# Altium footprint library xhayqua.PcbLib: 185 footprints (part 7 of 12)
Each footprint in its own frame and in the unit in brackets; x right, y up, seen from the top. Pads: shape width x height; smd on the part's side, far side on the other; paste and mask are expansions set on the pad; w line width, h text height; cw(c..) or ccw(c..) is an arc to the next point about the centre after c.
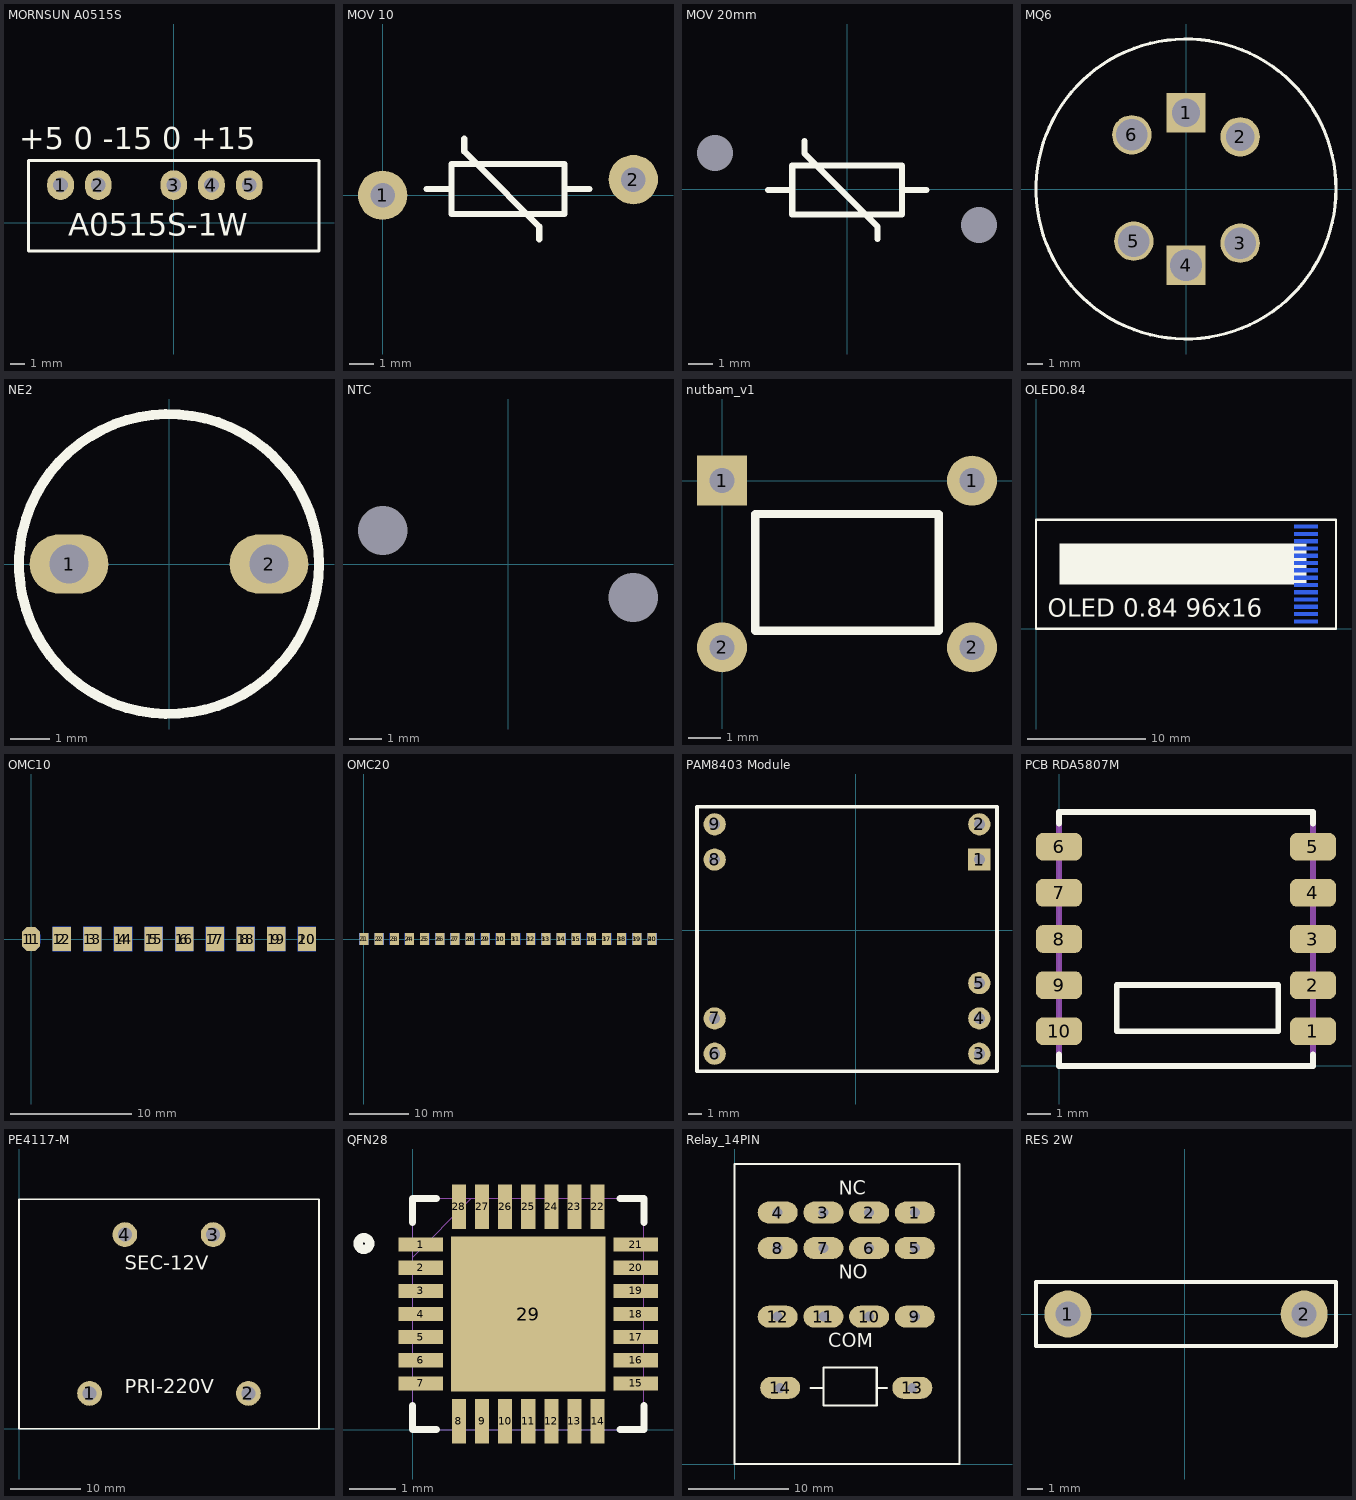
[diagram p6: the footprints below, top view; thin cyan lines are the x and y axes]

## MORNSUN A0515S [mm]
pads (5):
  oval 1.8x2 hole 1: 1(-7.62,2.54) 2(-5.08,2.54) 3(0,2.54) 4(2.54,2.54) 5(5.08,2.54)
Top Overlay:
  lines w0.2: -9.779,-1.905 -9.779,4.191 9.779,4.191 9.779,-1.905 -9.779,-1.905
  text "+5 0 -15 0 +15" at -10.414,4.953 h1.5
  text "A0515S-1W" at -7.112,-0.889 h1.52
3D body "MORNSUN F0512S_1WR2.x_t": height 9.31, standoff -3.69, extent -9.75,-1.867 9.75,4.143

## MOV 10 [mm] "MOV ZOV 10mm"
pads (2):
  round 2 hole 1: 1(0,0) 2(10.16,0.635)
Top Overlay:
  lines w0.254: 1.778,0.254 2.794,0.254 ; 3.302,2.286 3.302,1.778 3.81,1.27 6.35,-1.27 6.35,-1.778 ; 7.366,0.254 8.382,0.254 ; 2.794,-0.762 7.366,-0.762 7.366,1.27 2.794,1.27 2.794,-0.762
3D body "User Library-final MOV7,5.step": height 13.5, standoff -5, extent -0.379,-0.635 10.922,1.215

## MOV 20mm [mm]
pads (2):
  round 0 / inner round 0 / far side round 2.2 hole 1.5: 1(-5.5,1.5) 2(5.5,-1.5)
Top Overlay:
  lines w0.254: -3.298,-0.041 -2.282,-0.041 ; -1.774,1.991 -1.774,1.483 -1.266,0.975 1.274,-1.565 1.274,-2.073 ; 2.29,-0.041 3.306,-0.041 ; -2.282,-1.057 -2.282,0.975 2.29,0.975 2.29,-1.057 -2.282,-1.057
3D body "User Library-MOV, 130V, 20MM, 15KA, STRAIGHT LEAD, WPI VZ20E201KBSX-VBN.step": height 24.75, standoff -4, extent -10.156,-1.791 9.844,1.709

## MQ6 [mm]
pads (6):
  rect 2.5x2.5 hole 1.8: 1(0,4.826)
  round 2.5 hole 1.8: 2(3.429,3.302)
  round 2.5 hole 2: 3(3.429,-3.429) 6(-3.429,3.429)
  rect 2.5x2.5 hole 2: 4(0,-4.826)
  round 2.5 / inner round 2 / far side round 2 hole 2: 5(-3.302,-3.302)
Top Overlay:
  circle w0.2: c0,0 r9.5

## NE2 [mm]
pads (2):
  oval 2x1.5 hole 1: 1(-2.54,0) 2(2.54,0)
Top Overlay:
  circle w0.254: c0,0 r3.81
3D body "User Library-CAP_TANT_0_1.step": height 9.5, standoff -1.5, extent -2.174,-2.032 2.174,2.317

## NTC [mm] "Varistor pitch: 2.2x7.5mm diameter 12mm"
pads (2):
  round 0 / inner round 0 / far side oval 3x2.2 hole 1.5: 1(-3.81,1.016) 2(3.81,-1.016)
3D body "User Library-S10K275.STEP": height 13, standoff -2.5, extent -6,-1.9 6,1.902

## nutbam_v1 [mil]
pads (4):
  rect 60x60 hole 30: 1(0,0)
  round 60 hole 30: 1(300,0) 2(0,-200) 2(300,-200)
Top Overlay:
  lines w10: 40,-180 40,-40 260,-40 260,-180 40,-180

## OLED0.84 [mm]
pads (15):
  rect 2x0.32 smd far side: 1(22.94,0.62) 2(22.94,1.24) 3(22.94,1.86) 4(22.94,2.48) 5(22.94,3.1) 6(22.94,3.72) 7(22.94,4.34) 8(22.94,4.96) 9(22.94,5.58) 10(22.94,6.2) 11(22.94,6.82) 12(22.94,7.44) 13(22.94,8.06) 14(22.94,8.68)
  rect 21x3.5 on Top Overlay: ""(12.5,5.5)
Top Overlay:
  lines w0.2: 0,0 25.5,0 25.5,9.271 0,9.271 0,0
  text "OLED 0.84 96x16" at 1,1 h1.52
3D body "OLED 0.84.X_T": height 1.36, standoff -0.5, extent -0.025,-0.025 30.676,9.175

## OMC10 [mm]
pads (20):
  oct 1.5x2 smd: 1(0,0)
  rect 1.5x2 smd: 2(2.54,0) 3(5.08,0) 4(7.62,0) 5(10.16,0) 6(12.7,0) 7(15.24,0) 8(17.78,0) 9(20.32,0) 10(22.86,0)
  oval 1.5x2 smd far side: 11(0,0)
  rect 1.5x2 smd far side: 12(2.54,0) 13(5.08,0) 14(7.62,0) 15(10.16,0) 16(12.7,0) 17(15.24,0) 18(17.78,0) 19(20.32,0) 20(22.86,0)
3D body "User Library-Pin Header 2X10.STEP": height 2.33, standoff -2.75, extent -1.245,-1.182 24.155,9.818

## OMC20 [mm]
pads (40):
  rect 1.5x2 smd: 1(0,0) 2(2.54,0) 3(5.08,0) 4(7.62,0) 5(10.16,0) 6(12.7,0) 7(15.24,0) 8(17.78,0) 9(20.32,0) 10(22.86,0) 11(25.4,0) 12(27.94,0) 13(30.48,0) 14(33.02,0) 15(35.56,0) 16(38.1,0) 17(40.64,0) 18(43.18,0) 19(45.72,0) 20(48.26,0)
  rect 1.5x2 smd far side: 21(0,0) 22(2.54,0) 23(5.08,0) 24(7.62,0) 25(10.16,0) 26(12.7,0) 27(15.24,0) 28(17.78,0) 29(20.32,0) 30(22.86,0) 31(25.4,0) 32(27.94,0) 33(30.48,0) 34(33.02,0) 35(35.56,0) 36(38.1,0) 37(40.64,0) 38(43.18,0) 39(45.72,0) 40(48.26,0)

## PAM8403 Module [mm]
pads (9):
  rect 1.6x1.6 hole 0.8: 1(8.89,5.08)
  round 1.6 hole 0.8: 2(8.89,7.62) 3(8.89,-8.89) 4(8.89,-6.35) 5(8.89,-3.81) 6(-10.16,-8.89) 7(-10.16,-6.35) 8(-10.16,5.08) 9(-10.16,7.62)
Top Overlay:
  lines w0.254: -11.43,-10.16 -11.43,8.89 10.16,8.89 10.16,-10.16 -11.43,-10.16
3D body: height 2, standoff 0, extent -11.43,-10.16 10.16,8.89

## PCB RDA5807M [mm]
pads (10):
  rrect50% 2x1.2 smd: 1(11,1.5) 2(11,3.5) 3(11,5.5) 4(11,7.5) 5(11,9.5) 6(0,9.5) 7(0,7.5) 8(0,5.5) 9(0,3.5) 10(0,1.5)
Top Overlay:
  lines w0.254: 0,0.5 0,0 11,0 11,0.5 ; 0,10.5 0,11 11,11 11,10.5 ; 2.5,1.5 9.5,1.5 9.5,3.5 2.5,3.5 2.5,1.5
Mechanical 15:
  lines w0.254: 0,0 11,0 11,11 0,11 0,0
3D body: height 3, standoff 0, extent 0,0 11,11

## PE4117-M [mm] "Bien ap"
pads (4):
  round 3.5 hole 2: 1(10,5) 2(32.5,5) 3(27.5,27.5) 4(15,27.5)
Top Overlay:
  lines w0.254: 0,0 0,32.5 42.5,32.5 42.5,0 0,0
  text "SEC-12V" at 15,22.5 h2
  text "PRI-220V" at 15,5 h2

## QFN28 [mil]
pads (29):
  rect 38x12 smd mask+5: 1(7,157.56) 2(7,137.87) 3(7,118.19) 4(7,98.5) 5(7,78.81) 6(7,59.13) 7(7,39.44) 15(190,39.44) 16(190,59.13) 17(190,78.81) 18(190,98.5) 19(190,118.19) 20(190,137.87) 21(190,157.56)
  rect 12x38 smd mask+5: 8(39.44,7) 9(59.13,7) 10(78.81,7) 11(98.5,7) 12(118.19,7) 13(137.87,7) 14(157.56,7) 22(157.56,190) 23(137.87,190) 24(118.19,190) 25(98.5,190) 26(78.81,190) 27(59.13,190) 28(39.44,190)
  rect 132x132 smd mask-65.5: 29(98.5,98.5)
Top Overlay:
  circle w7.87: c-41.5,158.5 r5
  lines w6: 0,20.34 0,0 20.34,0 ; 0,176.66 0,197 20.34,197 ; 176.66,0 197,0 197,20.34 ; 176.66,197 197,197 197,176.66
Mechanical 1:
  lines w0: 0,147 50,197 ; 0,0 197,0 197,197 0,197 0,0 ; 0,33.44 0,45.44 0,33.44 ; 0,53.13 0,65.13 0,53.13 ; 0,72.81 0,84.81 0,72.81 ; 0,92.5 0,104.5 0,92.5 ; 0,112.19 0,124.19 0,112.19 ; 0,131.87 0,143.87 0,131.87 ; 0,151.56 0,163.56 0,151.56 ; 33.44,0 45.44,0 33.44,0 ; 33.44,197 45.44,197 33.44,197 ; 53.13,0 65.13,0 53.13,0 ; 53.13,197 65.13,197 53.13,197 ; 72.81,0 84.81,0 72.81,0 ; 72.81,197 84.81,197 72.81,197 ; 92.5,0 104.5,0 92.5,0 ; 92.5,197 104.5,197 92.5,197 ; 112.19,0 124.19,0 112.19,0 ; 112.19,197 124.19,197 112.19,197 ; 131.87,0 143.87,0 131.87,0 ; 131.87,197 143.87,197 131.87,197 ; 151.56,0 163.56,0 151.56,0 ; 151.56,197 163.56,197 151.56,197 ; 197,33.44 197,45.44 197,33.44 ; 197,53.13 197,65.13 197,53.13 ; 197,72.81 197,84.81 197,72.81 ; 197,92.5 197,104.5 197,92.5 ; 197,112.19 197,124.19 197,112.19 ; 197,131.87 197,143.87 197,131.87 ; 197,151.56 197,163.56 197,151.56

## Relay_14PIN [mm]
pads (14):
  oval 4x2.2 hole 1 square: 1(18.034,25.146) 2(13.462,25.146) 3(8.89,25.146) 4(4.318,25.146) 5(18.034,21.59) 6(13.462,21.59) 7(8.89,21.59) 8(4.318,21.59) 9(18.034,14.732) 10(13.462,14.732) 11(8.89,14.732) 12(4.318,14.732) 13(17.78,7.62) 14(4.572,7.62)
Top Overlay:
  lines w0.203: 7.62,7.62 8.89,7.62 ; 14.224,7.62 15.24,7.62 ; 0,0 0,30 22.5,30 22.5,0 0,0 ; 8.89,5.842 8.89,9.652 14.224,9.652 14.224,5.842 8.89,5.842
  text "NO" at 10.414,18.542 h1.4
  text "NC" at 10.414,26.924 h1.4
  text "COM" at 9.398,11.684 h1.4
3D body "User Library-relay_24v_plugin-1.STEP": height 35.71, standoff -5.69, extent 0,0 22.5,29.7

## RES 2W [mm]
pads (2):
  round 3 hole 1.6: 1(-7.474,0) 2(7.639,0)
Top Overlay:
  lines w0.254: -9.506,-2.032 -9.506,2.032 9.671,2.032 9.671,-2.032 -9.506,-2.032
3D body "User Library-PR02.x_b": height 4.23, standoff -8.14, extent -8.02,-1.95 8.02,1.95